# Altium schematic symbol library IC_TI.SCHLIB: 1162 symbols (part 7 of 8)
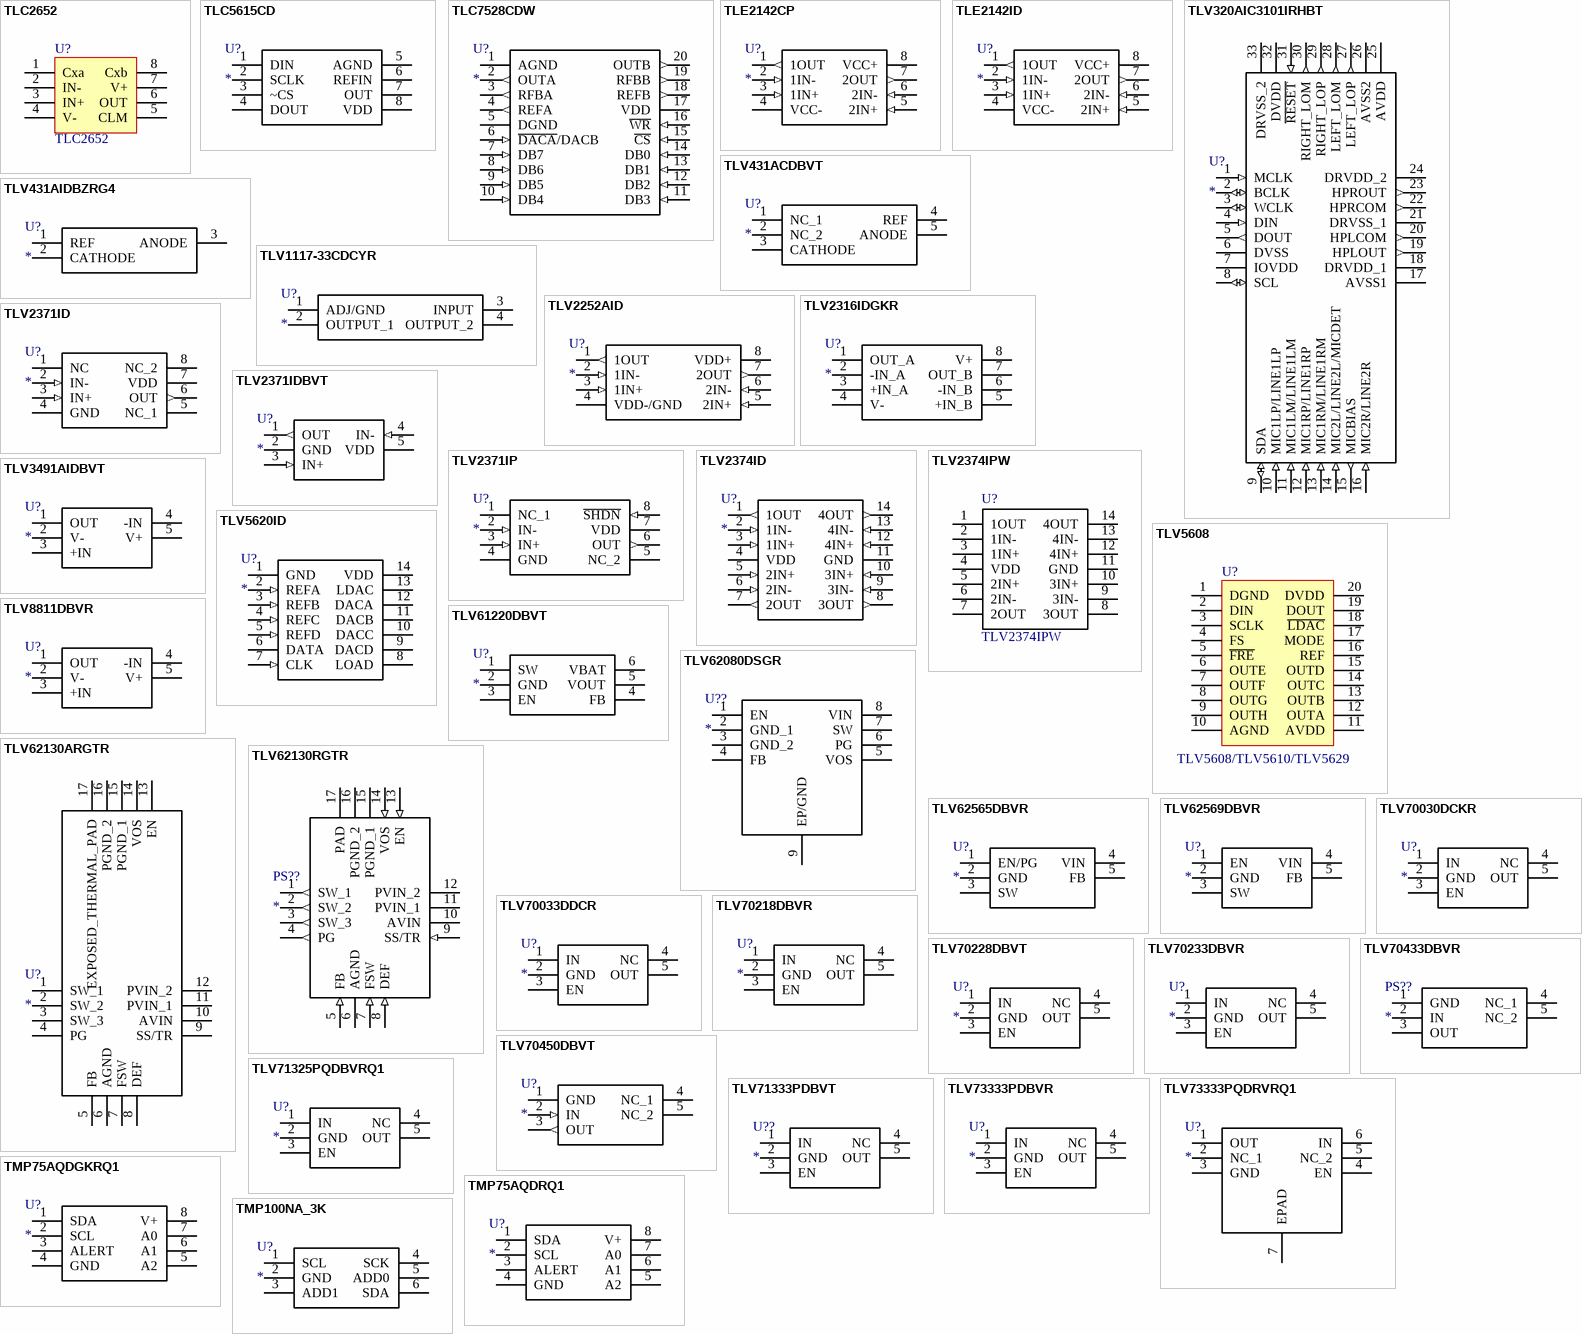
[diagram p41: symbols TLC2652 to TMP100NA_3K]

## TLV2316IDGKR
designator U?
Integrated Circuit; Manufacturer_Name: Texas Instruments; Manufacturer_Part_Number: TLV2316IDGKR; Datasheet Link: http://www.ti.com/lit/gpn/tlv2316; Height: 1.1mm; Mouser Part Number: 595-TLV2316IDGKR; Mouser Price/Stock: https://www.mouser.com/Search/Refine.aspx?Keyword=595-TLV2316IDGKR; RS Part Number: 1330718P; RS Price/Stock: http://uk.rs-online.com/web/p/products/1330718P
footprint VSSOP8_0.65
pins: 1 OUT_A, 2 -IN_A, 3 +IN_A, 4 V-, 5 +IN_B, 6 -IN_B, 7 OUT_B, 8 V+

## TLV2371ID
designator U?
Integrated Circuit; Manufacturer_Name: Texas Instruments; Manufacturer_Part_Number: TLV2371ID; Datasheet Link: http://www.ti.com/lit/ds/symlink/tlv2371.pdf; Height: 1.75mm; Mouser Part Number: 595-TLV2371ID; Mouser Price/Stock: https://www.mouser.com/Search/Refine.aspx?Keyword=595-TLV2371ID; RS Part Number: 5170980P; RS Price/Stock: http://uk.rs-online.com/web/p/products/5170980P
footprint SOIC8_1.27 (SOP, 8-Leads, Pitch 1.27mm)
pins: 1 NC, 2 IN- (in), 3 IN+ (in), 4 GND (power), 5 NC_1, 6 OUT (out), 7 VDD (power), 8 NC_2

## TLV2371IDBVT
designator U?
Integrated Circuit; Manufacturer_Name: Texas Instruments; Manufacturer_Part_Number: TLV2371IDBVT; Datasheet Link: http://docs-emea.rs-online.com/webdocs/0624/0900766b806249e2.pdf; Height: 1.45mm; Mouser Part Number: 595-TLV2371IDBVT; Mouser Price/Stock: https://www.mouser.com/Search/Refine.aspx?Keyword=595-TLV2371IDBVT; RS Part Number: 5170996P; RS Price/Stock: http://uk.rs-online.com/web/p/products/5170996P
footprint SOT23-5 (SOT23, 5-Leads, Body 3.0x3.0mm (max), Pitch 0.95mm, IPC Medium Density)
pins: 1 OUT (out), 2 GND (power), 3 IN+ (in), 4 IN- (in), 5 VDD (power)

## TLV2371IP
designator U?
Integrated Circuit; Manufacturer_Name: Texas Instruments; Manufacturer_Part_Number: TLV2371IP; Datasheet Link: http://www.ti.com/lit/gpn/tlv2371; Height: 5.08mm; Mouser Part Number: 595-TLV2371IP; Mouser Price/Stock: https://www.mouser.com/Search/Refine.aspx?Keyword=595-TLV2371IP; RS Part Number: 1628728; RS Price/Stock: http://uk.rs-online.com/web/p/products/1628728
footprint DIP8-A
pins: 1 NC_1, 2 IN- (in), 3 IN+ (in), 4 GND (power), 5 NC_2, 6 OUT (out), 7 VDD (power), 8 ~{SHDN} (in)

## TLV2374ID
designator U?
Integrated Circuit; Manufacturer_Name: Texas Instruments; Manufacturer_Part_Number: TLV2374ID; Datasheet Link: http://www.ti.com/lit/ds/symlink/tlv2374.pdf; Height: 1.75mm; Mouser Part Number: 595-TLV2374ID; Mouser Price/Stock: https://www.mouser.com/Search/Refine.aspx?Keyword=595-TLV2374ID; RS Part Number: 9203400; RS Price/Stock: http://uk.rs-online.com/web/p/products/9203400
footprint SOIC14_1.27
pins: 1 1OUT (out), 2 1IN- (in), 3 1IN+ (in), 4 VDD (power), 5 2IN+ (in), 6 2IN- (in), 7 2OUT (out), 8 3OUT (out), 9 3IN- (in), 10 3IN+ (in), 11 GND (power), 12 4IN+ (in), 13 4IN- (in), 14 4OUT (out)

## TLV2374IPW
designator U?
Integrated Circuit; Manufacturer_Name: Texas Instruments; Datasheet Link: http://www.ti.com/lit/ds/symlink/tlv2374.pdf; Height: 1.2mm; Manufacturer_Part_Number: TLV2374IPW; Mouser Part Number: 595-TLV2374IPW; Mouser Price/Stock: https://www.mouser.com/Search/Refine.aspx?Keyword=595-TLV2374IPW; RS Part Number: 1218423; RS Price/Stock: http://uk.rs-online.com/web/p/products/1218423
footprint TSSOP14_0.65 (TSOP, 14-Leads, Body 5.00x4.40mm, Pitch 0.65mm, Thermal Pad 2.31x2.46mm, IPC Low Density)
pins: 1 1OUT, 2 1IN-, 3 1IN+, 4 VDD, 5 2IN+, 6 2IN-, 7 2OUT, 8 3OUT, 9 3IN-, 10 3IN+, 11 GND, 12 4IN+, 13 4IN-, 14 4OUT

## TLV3491AIDBVT
designator U?
Integrated Circuit; Manufacturer_Name: Texas Instruments; Manufacturer_Part_Number: TLV3491AIDBVT; Datasheet Link: http://www.ti.com/lit/gpn/tlv3491; Mouser Part Number: 595-TLV3491AIDBVT; Mouser Price/Stock: https://www.mouser.com/Search/Refine.aspx?Keyword=595-TLV3491AIDBVT; RS Part Number: 4625338; RS Price/Stock: http://uk.rs-online.com/web/p/products/4625338
footprint SOT23-5 (SOT23, 5-Leads, Body 3.0x3.0mm (max), Pitch 0.95mm, IPC Medium Density)
pins: 1 OUT, 2 V-, 3 +IN, 4 -IN, 5 V+

## TLV5608
designator U?, comment TLV5608/TLV5610/TLV5629
footprint SOIC20W_1.27
pins: 1 DGND, 2 DIN, 3 SCLK, 4 FS, 5 ~{FRE}, 6 OUTE, 7 OUTF, 8 OUTG, 9 OUTH, 10 AGND, 11 AVDD, 12 OUTA, 13 OUTB, 14 OUTC, 15 OUTD, 16 REF, 17 MODE, 18 ~{LDAC}, 19 DOUT, 20 DVDD

## TLV5620ID
designator U?
Integrated Circuit; Manufacturer_Name: Texas Instruments; Manufacturer_Part_Number: TLV5620ID; Datasheet Link: http://www.ti.com/lit/ds/symlink/tlv5620.pdf; Height: 1.75mm; RS Part Number: 4626915; RS Price/Stock: http://uk.rs-online.com/web/p/general-purpose-dacs/4626915/?source=DS
footprint SOIC14_1.27
pins: 1 GND (power), 2 REFA (in), 3 REFB (in), 4 REFC (in), 5 REFD (in), 6 DATA, 7 CLK (in), 8 LOAD, 9 DACD, 10 DACC, 11 DACB, 12 DACA, 13 LDAC, 14 VDD (power)

## TLV8811DBVR
designator U?
Integrated Circuit; Manufacturer_Name: Texas Instruments; Manufacturer_Part_Number: TLV8811DBVR; Datasheet Link: http://www.ti.com/general/docs/lit/getliterature.tsp?genericPartNumber=tlv8811&fileType=pdf; Height: 1.45mm; Mouser Part Number: 595-TLV8811DBVR; Mouser Price/Stock: https://www.mouser.com/Search/Refine.aspx?Keyword=595-TLV8811DBVR
footprint SOT23-5 (SOT23, 5-Leads, Body 3.0x3.0mm (max), Pitch 0.95mm, IPC Medium Density)
pins: 1 OUT, 2 V-, 3 +IN, 4 -IN, 5 V+

## TLV61220DBVT
designator U?
Integrated Circuit; Manufacturer_Name: Texas Instruments; Manufacturer_Part_Number: TLV61220DBVT; Datasheet Link: http://www.ti.com/lit/ds/symlink/tlv61220.pdf; Height: 1.45mm; Mouser Part Number: 595-TLV61220DBVT; Mouser Price/Stock: https://www.mouser.com/Search/Refine.aspx?Keyword=595-TLV61220DBVT; RS Part Number: 1684369; RS Price/Stock: http://uk.rs-online.com/web/p/products/1684369
footprint SOT23-6
pins: 1 SW, 2 GND, 3 EN, 4 FB, 5 VOUT, 6 VBAT

## TLV62080DSGR
designator U??
Undefined or Miscellaneous; Manufacturer_Name: Texas Instruments; Manufacturer_Part_Number: TLV62080DSGR; Datasheet Link: https://www.arrow.com/en/products/tlv62080dsgr/texas-instruments; Height: 0.8mm; Mouser Part Number: 595-TLV62080DSGR; Mouser Price/Stock: https://www.mouser.com/Search/Refine.aspx?Keyword=595-TLV62080DSGR
footprint DFN8_0.5-PAD(2X2) (DFN8_0.5-PAD(3X3))
pins: 1 EN, 2 GND_1, 3 GND_2, 4 FB, 5 VOS, 6 PG, 7 SW, 8 VIN, 9 EP/GND

## TLV62130ARGTR
designator U?
Integrated Circuit; Manufacturer_Name: Texas Instruments; Manufacturer_Part_Number: TLV62130ARGTR; Datasheet Link: http://www.ti.com/lit/ds/symlink/tlv62130a.pdf; Height: 1mm; Mouser Part Number: 595-TLV62130ARGTR; Mouser Price/Stock: https://www.mouser.com/Search/Refine.aspx?Keyword=595-TLV62130ARGTR
footprint QFN16_0.5-PAD(3X3) (QFN, 16-Leads, Body 3.0x3.0mm (max), Pitch 0.50mm, IPC Low Density)
pins: 1 SW_1, 2 SW_2, 3 SW_3, 4 PG, 5 FB, 6 AGND, 7 FSW, 8 DEF, 9 SS/TR, 10 AVIN, 11 PVIN_1, 12 PVIN_2, 13 EN, 14 VOS, 15 PGND_1, 16 PGND_2, 17 EXPOSED_THERMAL_PAD

## TLV62130RGTR
designator PS??
Power Supply; Manufacturer_Name: Texas Instruments; Manufacturer_Part_Number: TLV62130RGTR; Datasheet Link: http://www.ti.com/lit/gpn/tlv62130; Height: 1mm; Mouser Part Number: 595-TLV62130RGTR; Mouser Price/Stock: https://www.mouser.com/Search/Refine.aspx?Keyword=595-TLV62130RGTR; RS Part Number: 1789011; RS Price/Stock: http://uk.rs-online.com/web/p/products/1789011
footprint QFN16_0.5-PAD(3X3) (QFN, 16-Leads, Body 3.0x3.0mm (max), Pitch 0.50mm, IPC Low Density)
pins: 1 SW_1 (out), 2 SW_2 (out), 3 SW_3 (out), 4 PG (out), 5 FB (in), 6 AGND (power), 7 FSW (in), 8 DEF (in), 9 SS/TR (in), 10 AVIN (power), 11 PVIN_1 (power), 12 PVIN_2 (power), 13 EN (in), 14 VOS (in), 15 PGND_1 (power), 16 PGND_2 (power), 17 PAD (power)

## TLV62565DBVR
designator U?
Integrated Circuit; Manufacturer_Name: Texas Instruments; Manufacturer_Part_Number: TLV62565DBVR; Datasheet Link: http://www.ti.com/lit/gpn/tlv62565; Height: 1.45mm; Mouser Part Number: 595-TLV62565DBVR; Mouser Price/Stock: https://www.mouser.com/Search/Refine.aspx?Keyword=595-TLV62565DBVR
footprint SOT23-5 (SOT23, 5-Leads, Body 3.0x3.0mm (max), Pitch 0.95mm, IPC Medium Density)
pins: 1 EN/PG, 2 GND, 3 SW, 4 VIN, 5 FB

## TLV62569DBVR
designator U?
Integrated Circuit; Manufacturer_Name: Texas Instruments; Manufacturer_Part_Number: TLV62569DBVR; Datasheet Link: http://www.ti.com/lit/gpn/tlv62569; Height: 1.45mm; Mouser Part Number: 595-TLV62569DBVR; Mouser Price/Stock: https://www.mouser.com/Search/Refine.aspx?Keyword=595-TLV62569DBVR
footprint SOT23-5 (SOT23, 5-Leads, Body 3.0x3.0mm (max), Pitch 0.95mm, IPC Medium Density)
pins: 1 EN, 2 GND, 3 SW, 4 VIN, 5 FB

## TLV70030DCKR
designator U?
Integrated Circuit; Manufacturer_Name: Texas Instruments; Manufacturer_Part_Number: TLV70030DCKR; Mouser Part Number: 595-TLV70030DCKR; Mouser Price/Stock: https://www.mouser.com/Search/Refine.aspx?Keyword=595-TLV70030DCKR
footprint SOT353
pins: 1 IN, 2 GND, 3 EN, 4 NC, 5 OUT

## TLV70033DDCR
designator U?
Integrated Circuit; Manufacturer_Name: Texas Instruments; Manufacturer_Part_Number: TLV70033DDCR; Datasheet Link: http://componentsearchengine.com/Datasheets/1/TLV70033DDCR.pdf; Mouser Part Number: 595-TLV70033DDCR; Mouser Price/Stock: https://www.mouser.com/Search/Refine.aspx?Keyword=595-TLV70033DDCR
footprint SOT23-5 (SOT23, 5-Leads, Body 3.0x3.0mm (max), Pitch 0.95mm, IPC Medium Density)
pins: 1 IN, 2 GND, 3 EN, 4 NC, 5 OUT

## TLV70218DBVR
designator U?
Integrated Circuit; Manufacturer_Name: Texas Instruments; Manufacturer_Part_Number: TLV70218DBVR; Datasheet Link: http://www.ti.com/lit/gpn/tlv702; Height: 1.45mm; Mouser Part Number: 595-TLV70218DBVR; Mouser Price/Stock: https://www.mouser.com/Search/Refine.aspx?Keyword=595-TLV70218DBVR
footprint SOT23-5 (SOT23, 5-Leads, Body 3.0x3.0mm (max), Pitch 0.95mm, IPC Medium Density)
pins: 1 IN, 2 GND, 3 EN, 4 NC, 5 OUT

## TLV70228DBVT
designator U?
Integrated Circuit; Manufacturer_Name: Texas Instruments; Manufacturer_Part_Number: TLV70228DBVT; Datasheet Link: http://www.ti.com/lit/gpn/tlv702p; Height: 1.45mm; Mouser Part Number: 595-TLV70228DBVT; Mouser Price/Stock: https://www.mouser.com/Search/Refine.aspx?Keyword=595-TLV70228DBVT; RS Part Number: 8253716P; RS Price/Stock: http://uk.rs-online.com/web/p/products/8253716P
footprint SOT23-5 (SOT23, 5-Leads, Body 3.0x3.0mm (max), Pitch 0.95mm, IPC Medium Density)
pins: 1 IN, 2 GND, 3 EN, 4 NC, 5 OUT

## TLV70233DBVR
designator U?
Integrated Circuit; Manufacturer_Name: Texas Instruments; Manufacturer_Part_Number: TLV70233DBVR; Datasheet Link: http://www.ti.com/lit/gpn/tlv702; Height: 1.45mm; Mouser Part Number: 595-TLV70233DBVR; Mouser Price/Stock: https://www.mouser.com/Search/Refine.aspx?Keyword=595-TLV70233DBVR
footprint SOT23-5 (SOT23, 5-Leads, Body 3.0x3.0mm (max), Pitch 0.95mm, IPC Medium Density)
pins: 1 IN, 2 GND, 3 EN, 4 NC, 5 OUT

## TLV70433DBVR
designator PS??
Power Supply; Manufacturer_Name: Texas Instruments; Manufacturer_Part_Number: TLV70433DBVR; Datasheet Link: http://www.ti.com/lit/gpn/tlv704; Height: 1.45mm; Mouser Part Number: 595-TLV70433DBVR; Mouser Price/Stock: https://www.mouser.com/Search/Refine.aspx?Keyword=595-TLV70433DBVR
footprint SOT23-5 (SOT23, 5-Leads, Body 3.0x3.0mm (max), Pitch 0.95mm, IPC Medium Density)
pins: 1 GND (power), 2 IN (power), 3 OUT (power), 4 NC_1, 5 NC_2

## TLV70450DBVT
designator U?
Integrated Circuit; Manufacturer_Name: Texas Instruments; Manufacturer_Part_Number: TLV70450DBVT; Datasheet Link: http://www.ti.com/lit/ds/symlink/tlv704.pdf; Height: 1.45mm; Mouser Part Number: 595-TLV70450DBVT; Mouser Price/Stock: https://www.mouser.com/Search/Refine.aspx?Keyword=595-TLV70450DBVT; RS Part Number: 8253729P; RS Price/Stock: http://uk.rs-online.com/web/p/products/8253729P
footprint SOT23-5 (SOT23, 5-Leads, Body 3.0x3.0mm (max), Pitch 0.95mm, IPC Medium Density)
pins: 1 GND (power), 2 IN (in), 3 OUT (out), 4 NC_1, 5 NC_2

## TLV71325PQDBVRQ1
designator U?
Integrated Circuit; Manufacturer_Name: Texas Instruments; Manufacturer_Part_Number: TLV71325PQDBVRQ1; Datasheet Link: http://www.ti.com/lit/gpn/tlv713p-q1; Height: 1.45mm; Mouser Part Number: 595-TLV71325PQDBVRQ1; Mouser Price/Stock: https://www.mouser.com/Search/Refine.aspx?Keyword=595-TLV71325PQDBVRQ1
footprint SOT23-5 (SOT23, 5-Leads, Body 3.0x3.0mm (max), Pitch 0.95mm, IPC Medium Density)
pins: 1 IN, 2 GND, 3 EN, 4 NC, 5 OUT

## TLV71333PDBVT
designator U??
Undefined or Miscellaneous; Manufacturer_Name: Texas Instruments; Manufacturer_Part_Number: TLV71333PDBVT; Datasheet Link: http://www.ti.com/lit/ds/symlink/tlv713p.pdf; Height: 1.45mm; Mouser Part Number: 595-TLV71333PDBVT; Mouser Price/Stock: https://www.mouser.com/Search/Refine.aspx?Keyword=595-TLV71333PDBVT; RS Part Number: 1451339; RS Price/Stock: http://uk.rs-online.com/web/p/products/1451339
footprint SOT23-5 (SOT23, 5-Leads, Body 3.0x3.0mm (max), Pitch 0.95mm, IPC Medium Density)
pins: 1 IN, 2 GND, 3 EN, 4 NC, 5 OUT

## TLV73333PDBVR
designator U?
Integrated Circuit; Manufacturer_Name: Texas Instruments; Manufacturer_Part_Number: TLV73333PDBVR; Datasheet Link: http://www.ti.com/lit/gpn/tlv733p; Height: 1.45mm; Mouser Part Number: 595-TLV73333PDBVR; Mouser Price/Stock: https://www.mouser.com/Search/Refine.aspx?Keyword=595-TLV73333PDBVR
footprint SOT23-5 (SOT23, 5-Leads, Body 3.0x3.0mm (max), Pitch 0.95mm, IPC Medium Density)
pins: 1 IN, 2 GND, 3 EN, 4 NC, 5 OUT

## TLV73333PQDRVRQ1
designator U?
Integrated Circuit; Manufacturer_Name: Texas Instruments; Manufacturer_Part_Number: TLV73333PQDRVRQ1; Datasheet Link: http://www.ti.com/lit/gpn/tlv733p-q1; Height: 0.8mm; Mouser Part Number: 595-TLV73333PQDRVRQ1; Mouser Price/Stock: https://www.mouser.com/Search/Refine.aspx?Keyword=595-TLV73333PQDRVRQ1
footprint DFN6_0.65-PAD(2.2X2.5)
pins: 1 OUT, 2 NC_1, 3 GND, 4 EN, 5 NC_2, 6 IN, 7 EPAD

## TMP75AQDGKRQ1
designator U?
Integrated Circuit; Manufacturer_Name: Texas Instruments; Manufacturer_Part_Number: TMP75AQDGKRQ1; Datasheet Link: http://www.ti.com/lit/ds/symlink/tmp75-q1.pdf; Height: 1.1mm; Mouser Part Number: 595-TMP75AQDGKRQ1; Mouser Price/Stock: https://www.mouser.com/Search/Refine.aspx?Keyword=595-TMP75AQDGKRQ1
footprint VSSOP8_0.65-PAD
pins: 1 SDA, 2 SCL, 3 ALERT, 4 GND, 5 A2, 6 A1, 7 A0, 8 V+

## TMP75AQDRQ1
designator U?
Integrated Circuit; Manufacturer_Name: Texas Instruments; Manufacturer_Part_Number: TMP75AQDRQ1; Datasheet Link: http://www.ti.com/lit/ds/symlink/tmp75-q1.pdf; Height: 1.75mm; Mouser Part Number: 595-TMP75AQDRQ1; Mouser Price/Stock: https://www.mouser.com/Search/Refine.aspx?Keyword=595-TMP75AQDRQ1
footprint SOIC8_1.27 (SOP, 8-Leads, Pitch 1.27mm)
pins: 1 SDA, 2 SCL, 3 ALERT, 4 GND, 5 A2, 6 A1, 7 A0, 8 V+

## TMP100NA_3K
designator U?
Integrated Circuit; Manufacturer_Name: Texas Instruments; Manufacturer_Part_Number: TMP100NA/3K; Datasheet Link: http://www.ti.com/lit/gpn/tmp100; Mouser Part Number: 595-TMP100NA/3K; Mouser Price/Stock: https://www.mouser.com/Search/Refine.aspx?Keyword=595-TMP100NA%2F3K
footprint SOT23-6
pins: 1 SCL, 2 GND, 3 ADD1, 4 SCK, 5 ADD0, 6 SDA

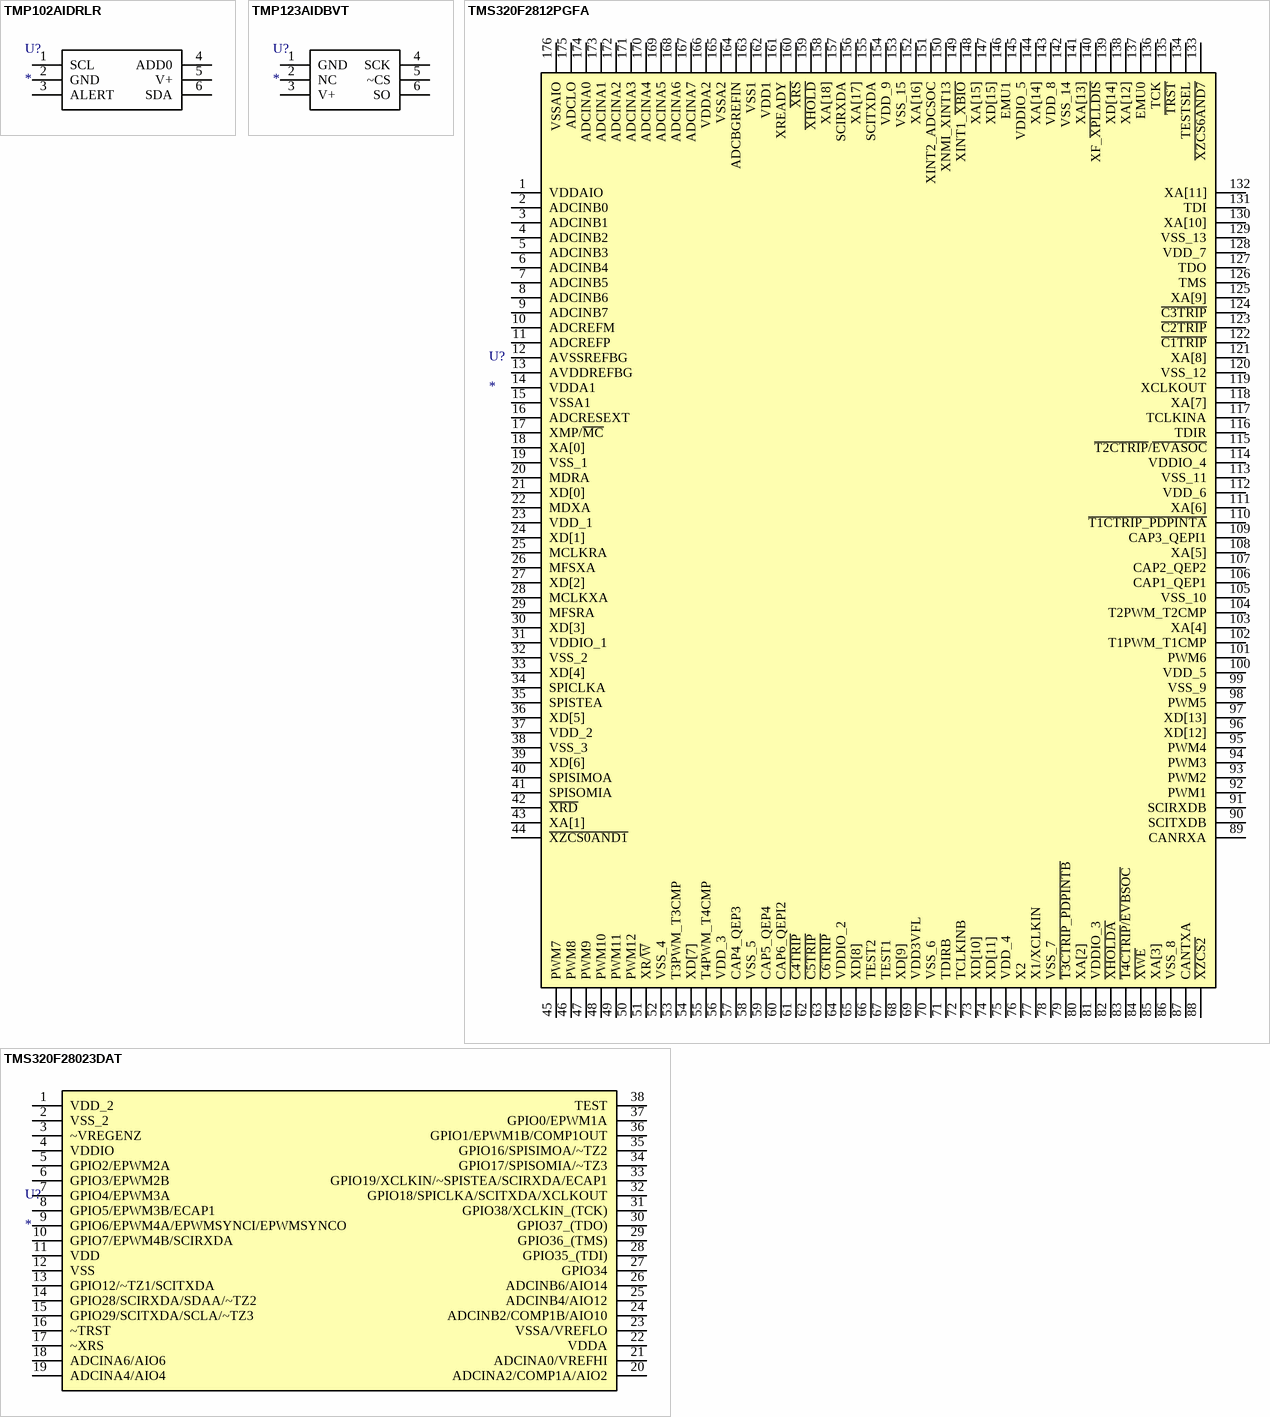
[diagram p28: symbols TMP102AIDRLR to TMS320F28023DAT]

## TMP102AIDRLR
designator U?
Integrated Circuit; Manufacturer_Name: Texas Instruments; Manufacturer_Part_Number: TMP102AIDRLR; Datasheet Link: http://www.ti.com/lit/gpn/tmp102; Height: 0.6mm; Mouser Part Number: 595-TMP102AIDRLR; Mouser Price/Stock: https://www.mouser.com/Search/Refine.aspx?Keyword=595-TMP102AIDRLR
footprint SOT563
pins: 1 SCL, 2 GND, 3 ALERT, 4 ADD0, 5 V+, 6 SDA

## TMP123AIDBVT
designator U?
Integrated Circuit; Manufacturer_Name: Texas Instruments; Manufacturer_Part_Number: TMP123AIDBVT; Datasheet Link: http://www.ti.com/lit/gpn/tmp123; Mouser Part Number: 595-TMP123AIDBVT; Mouser Price/Stock: https://www.mouser.com/Search/Refine.aspx?Keyword=595-TMP123AIDBVT; RS Part Number: 6623882P; RS Price/Stock: http://uk.rs-online.com/web/p/products/6623882P
footprint SOT23-6
pins: 1 GND, 2 NC, 3 V+, 4 SCK, 5 ~CS, 6 SO

## TMS320F2812PGFA
designator U?
Integrated Circuit; Manufacturer_Name: Texas Instruments; Manufacturer_Part_Number: TMS320F2812PGFA; Datasheet Link: http://www.ti.com/lit/ds/symlink/tms320f2812.pdf; Height: 1.6mm; Mouser Part Number: 595-TMS320F2812PGFA; Mouser Price/Stock: https://www.mouser.com/Search/Refine.aspx?Keyword=595-TMS320F2812PGFA; RS Part Number: 7093908P; RS Price/Stock: http://uk.rs-online.com/web/p/products/7093908P
footprint LQFP176_0.5MM
pins: 1 VDDAIO, 2 ADCINB0, 3 ADCINB1, 4 ADCINB2, 5 ADCINB3, 6 ADCINB4, 7 ADCINB5, 8 ADCINB6, 9 ADCINB7, 10 ADCREFM, 11 ADCREFP, 12 AVSSREFBG, 13 AVDDREFBG, 14 VDDA1, 15 VSSA1, 16 ADCRESEXT, 17 XMP/~{MC}, 18 XA[0], 19 VSS_1, 20 MDRA, 21 XD[0], 22 MDXA, 23 VDD_1, 24 XD[1], 25 MCLKRA, 26 MFSXA, 27 XD[2], 28 MCLKXA, 29 MFSRA, 30 XD[3], 31 VDDIO_1, 32 VSS_2, 33 XD[4], 34 SPICLKA, 35 SPISTEA, 36 XD[5], 37 VDD_2, 38 VSS_3, 39 XD[6], 40 SPISIMOA, 41 SPISOMIA, 42 ~{XRD}, 43 XA[1], 44 ~{XZCS0AND1}, 45 PWM7, 46 PWM8, 47 PWM9, 48 PWM10, 49 PWM11, 50 PWM12, 51 XR/~{W}, 52 VSS_4, 53 T3PWM_T3CMP, 54 XD[7], 55 T4PWM_T4CMP, 56 VDD_3, 57 CAP4_QEP3, 58 VSS_5, 59 CAP5_QEP4, 60 CAP6_QEPI2, 61 ~{C4TRIP}, 62 ~{C5TRIP}, 63 ~{C6TRIP}, 64 VDDIO_2, 65 XD[8], 66 TEST2, 67 TEST1, 68 XD[9], 69 VDD3VFL, 70 VSS_6, 71 TDIRB, 72 TCLKINB, 73 XD[10], 74 XD[11], 75 VDD_4, 76 X2, 77 X1/XCLKIN, 78 VSS_7, 79 ~{T3CTRIP_PDPINTB}, 80 XA[2], 81 VDDIO_3, 82 ~{XHOLDA}, 83 ~{T4CTRIP}/~{EVBSOC}, 84 ~{XWE}, 85 XA[3], 86 VSS_8, 87 CANTXA, 88 ~{XZCS2}, 89 CANRXA, 90 SCITXDB, 91 SCIRXDB, 92 PWM1, 93 PWM2, 94 PWM3, 95 PWM4, 96 XD[12], 97 XD[13], 98 PWM5, 99 VSS_9, 100 VDD_5, 101 PWM6, 102 T1PWM_T1CMP, 103 XA[4], 104 T2PWM_T2CMP, 105 VSS_10, 106 CAP1_QEP1, 107 CAP2_QEP2, 108 XA[5], 109 CAP3_QEPI1, 110 ~{T1CTRIP_PDPINTA}, 111 XA[6], 112 VDD_6, 113 VSS_11, 114 VDDIO_4, 115 ~{T2CTRIP}/~{EVASOC}, 116 TDIR, 117 TCLKINA, 118 XA[7], 119 XCLKOUT, 120 VSS_12, 121 XA[8], 122 ~{C1TRIP}, 123 ~{C2TRIP}, 124 ~{C3TRIP}, 125 XA[9], 126 TMS, 127 TDO, 128 VDD_7, 129 VSS_13, 130 XA[10], 131 TDI, 132 XA[11], 133 ~{XZCS6AND7}, 134 TESTSEL, 135 ~{TRST}, 136 TCK, 137 EMU0, 138 XA[12], 139 XD[14], 140 XF_~{XPLLDIS}, 141 XA[13], 142 VSS_14, 143 VDD_8, 144 XA[14], 145 VDDIO_5, 146 EMU1, 147 XD[15], 148 XA[15], 149 XINT1_~{XBIO}, 150 XNMI_XINT13, 151 XINT2_ADCSOC, 152 XA[16], 153 VSS_15, 154 VDD_9, 155 SCITXDA, 156 XA[17], 157 SCIRXDA, 158 XA[18], 159 ~{XHOLD}, 160 ~{XRS}, 161 XREADY, 162 VDD1, 163 VSS1, 164 ADCBGREFIN, 165 VSSA2, 166 VDDA2, 167 ADCINA7, 168 ADCINA6, 169 ADCINA5, 170 ADCINA4, 171 ADCINA3, 172 ADCINA2, 173 ADCINA1, 174 ADCINA0, 175 ADCLO, 176 VSSAIO